# Altium footprint library IC.PcbLib: 85 footprints (part 1 of 6)
Each footprint in its own frame and in the unit in brackets; x right, y up, seen from the top. Pads: shape width x height; smd on the part's side, far side on the other; paste and mask are expansions set on the pad; w line width, h text height; cw(c..) or ccw(c..) is an arc to the next point about the centre after c.
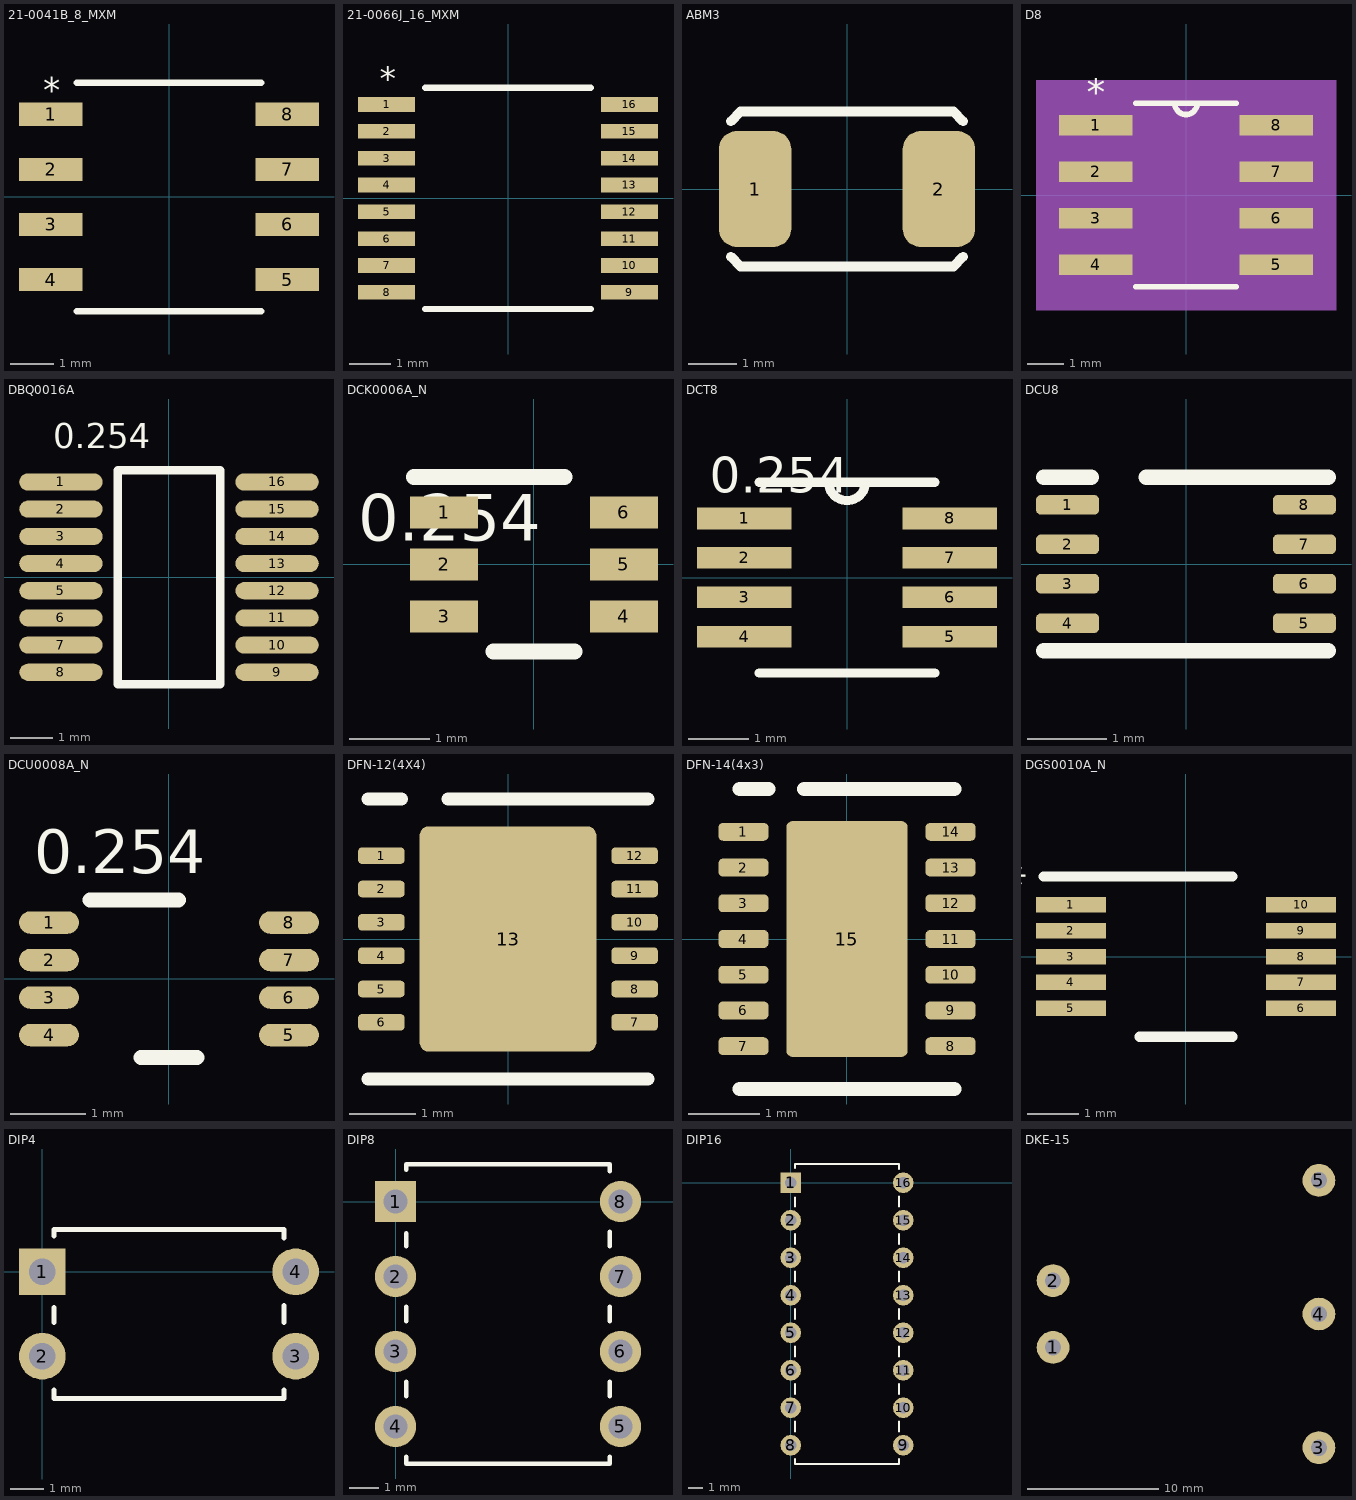
[diagram p0: the footprints below, top view; thin cyan lines are the x and y axes]

## 21-0041B_8_MXM [mil]
pads (8):
  rect 57.5x21 smd paste+0 mask+0: 1(-107.25,75) 2(-107.25,25) 3(-107.25,-25) 4(-107.25,-75) 5(107.25,-75) 6(107.25,-25) 7(107.25,25) 8(107.25,75)
Top Overlay:
  lines w6: -83.5,-103.5 83.5,-103.5 ; -83.5,103.5 83.5,103.5
  text "*" at -114.17,78.74 h39.37
3D body "21-0041B_8_MXM.step": height 69.09, standoff 0, extent -122.01,-98.5 122.01,98.5

## 21-0066J_16_MXM [mil]
pads (16):
  rect 54.5x14 smd paste+0: 1(-115.75,89.57) 2(-115.75,63.98) 3(-115.75,38.39) 4(-115.75,12.8) 5(-115.75,-12.8) 6(-115.75,-38.39) 7(-115.75,-63.98) 8(-115.75,-89.57) 9(115.75,-89.57) 10(115.75,-63.98) 11(115.75,-38.39) 12(115.75,-12.8) 13(115.75,12.8) 14(115.75,38.39) 15(115.75,63.98) 16(115.75,89.57)
Top Overlay:
  lines w6: -78.92,-105.5 78.92,-105.5 ; -78.92,105.5 78.92,105.5
  text "*" at -122.05,95.31 h39.37
3D body "21-0066J_16_MXM.step": height 43.11, standoff 0, extent -129.01,-100.51 129.02,100.52

## ABM3 [mm]
pads (2):
  rrect50% 1.5x2.4 smd: 1(-1.9,0) 2(1.9,0)
Top Overlay:
  lines w0.2: -2.4,-1.4 -2.2,-1.6 2.2,-1.6 2.4,-1.4 ; -2.4,1.4 -2.2,1.6 2.2,1.6 2.4,1.4
3D body: height 0.25, standoff 0, extent -2.5,-1.6 2.5,1.6

## D8 [mil]
pads (8):
  rect 78.74x22 smd: 1(-97,75) 2(-97,25) 3(-97,-25) 4(-97,-75) 5(97,-75) 6(97,-25) 7(97,25) 8(97,75)
Top Overlay:
  lines w6: -54.08,-98.5 54.08,-98.5 ; -54.08,98.5 54.08,98.5 ; -12,98.5 ccw(c0,98.5) 12,98.5
  text "*" at -106.3,86.61 h50
Mechanical 5:
  region: 161,-123.5 -161,-123.5 -161,123.5 161,123.5
Mechanical 13:
  lines w0: -12,98.5 ccw(c0,98.5) 12,98.5
  lines w1: -122,-85 -122,-65 -78.5,-65 -78.5,-85 -122,-85 ; -122,-35 -122,-15 -78.5,-15 -78.5,-35 -122,-35 ; -122,15 -122,35 -78.5,35 -78.5,15 -122,15 ; -122,65 -122,85 -78.5,85 -78.5,65 -122,65 ; -78.5,-98.5 78.5,-98.5 78.5,98.5 -78.5,98.5 -78.5,-98.5 ; 78.5,-85 78.5,-65 122,-65 122,-85 78.5,-85 ; 78.5,-35 78.5,-15 122,-15 122,-35 78.5,-35 ; 78.5,15 78.5,35 122,35 122,15 78.5,15 ; 78.5,65 78.5,85 122,85 122,65 78.5,65
  text "*" at -119.5,92 h50
Mechanical 15:
  region: 146,-108.5 -146,-108.5 -146,108.5 146,108.5
  lines w6: -146,-108.5 -146,108.5 146,108.5 146,-108.5 -146,-108.5
3D body "D8.step": height 69.09, standoff 0, extent -122.01,-98.5 122.01,98.5

## DBQ0016A [mm]
pads (16):
  oval 1.95x0.4 smd paste-0.102 mask+0.051: 1(-2.525,2.222) 2(-2.525,1.587) 3(-2.525,0.953) 4(-2.525,0.318) 5(-2.525,-0.318) 6(-2.525,-0.953) 7(-2.525,-1.587) 8(-2.525,-2.222) 9(2.525,-2.222) 10(2.525,-1.587) 11(2.525,-0.953) 12(2.525,-0.318) 13(2.525,0.318) 14(2.525,0.953) 15(2.525,1.587) 16(2.525,2.222)
Top Overlay:
  lines w0.2: -1.2,-2.5 1.2,-2.5 1.2,2.5 -1.2,2.5 -1.2,-2.5
  text "0.254" at -2.7,2.811 h1
3D body "DBQ0016A.stp": height 1.62, standoff 0, extent -3.011,-2.451 3.011,2.451

## DCK0006A_N [mm]
pads (6):
  rect 0.85x0.4 smd paste+0 mask+0.051: 1(-1.125,0.65) 2(-1.125,0) 3(-1.125,-0.65) 4(1.125,-0.65) 5(1.125,0) 6(1.125,0.65)
Top Overlay:
  lines w0.2: -1.499,1.092 0.381,1.092 ; -0.508,-1.092 0.508,-1.092
  text "0.254" at -2.2,0.1 h1
3D body "DCK0006A.stp": height 1, standoff 0, extent -1.05,-1 1.05,1

## DCT8 [mil]
pads (8):
  rect 61.5x14 smd: 1(-66.75,38.39) 2(-66.75,12.8) 3(-66.75,-12.8) 4(-66.75,-38.39) 5(66.75,-38.39) 6(66.75,-12.8) 7(66.75,12.8) 8(66.75,38.39)
Top Overlay:
  lines w6: -57,-62 57,-62 ; -57,62 57,62 ; -12,62 ccw(c0,62) 12,62
  text "0.254" at -89.25,47.39 h39.37
3D body "DCT0008A.stp": height 36.02, standoff 0, extent -79.15,-58.07 79.16,58.08

## DCU8 [mm]
pads (8):
  rrect50% 0.8x0.25 smd: 1(-1.5,0.75) 2(-1.5,0.25) 3(-1.5,-0.25) 4(-1.5,-0.75) 5(1.5,-0.75) 6(1.5,-0.25) 7(1.5,0.25) 8(1.5,0.75)
Top Overlay:
  lines w0.2: -1.8,-1.1 1.8,-1.1 ; -1.8,1.1 -1.2,1.1 ; -0.5,1.1 1.8,1.1
3D body "DCU0008A.stp": height 0.77, standoff 0, extent -1.55,-1 1.55,1

## DCU0008A_N [mm]
pads (8):
  oval 0.8x0.3 smd paste+0 mask+0.051: 1(-1.6,0.75) 2(-1.6,0.25) 3(-1.6,-0.25) 4(-1.6,-0.75) 5(1.6,-0.75) 6(1.6,-0.25) 7(1.6,0.25) 8(1.6,0.75)
Top Overlay:
  lines w0.2: -1.05,1.05 0.125,1.05 ; -0.375,-1.05 0.375,-1.05
  text "0.254" at -1.8,1.211 h1
3D body "DCU0008A.stp": height 0.77, standoff 0, extent -1.55,-1 1.55,1

## DFN-12(4X4) [mm]
pads (13):
  rrect50% 0.7x0.25 smd: 1(-1.9,1.25) 2(-1.9,0.75) 3(-1.9,0.25) 4(-1.9,-0.25) 5(-1.9,-0.75) 6(-1.9,-1.25) 7(1.9,-1.25) 8(1.9,-0.75) 9(1.9,-0.25) 10(1.9,0.25) 11(1.9,0.75) 12(1.9,1.25)
  rrect10% 2.65x3.38 smd: 13(0,0)
Top Overlay:
  lines w0.2: -2.1,-2.1 2.1,-2.1 ; -2.1,2.1 -1.6,2.1 ; -0.9,2.1 2.1,2.1
3D body "DFN-12_DF_LIT.step": height 0.8, standoff 0, extent -2.05,-2.05 2.05,2.05

## DFN-14(4x3) [mm]
pads (15):
  rrect50% 0.7x0.25 smd: 1(-1.45,1.5) 2(-1.45,1) 3(-1.45,0.5) 4(-1.45,0) 5(-1.45,-0.5) 6(-1.45,-1) 7(-1.45,-1.5) 8(1.45,-1.5) 9(1.45,-1) 10(1.45,-0.5) 11(1.45,0) 12(1.45,0.5) 13(1.45,1) 14(1.45,1.5)
  rrect10% 1.7x3.3 smd: 15(0,0)
Top Overlay:
  lines w0.2: -1.5,-2.1 1.5,-2.1 ; -1.5,2.1 -1.1,2.1 ; -0.6,2.1 1.5,2.1
3D body "DE_14_ADI.step": height 0.81, standoff 0, extent -1.499,-2.007 1.499,2.007

## DGS0010A_N [mm]
pads (10):
  rect 1.35x0.3 smd paste+0 mask+0.051: 1(-2.225,1) 2(-2.225,0.5) 3(-2.225,0) 4(-2.225,-0.5) 5(-2.225,-1) 6(2.225,-1) 7(2.225,-0.5) 8(2.225,0) 9(2.225,0.5) 10(2.225,1)
Top Overlay:
  lines w0.2: -2.75,1.55 0.9,1.55 ; -0.9,-1.55 0.9,-1.55
  text "*" at -2.685,1.356 h1
3D body: height 0.25, standoff 0, extent 0,0 0.254,0.254
3D body "DGS0010A.stp": height 1.11, standoff 0.01, extent -2.463,-1.5 2.463,1.5

## DIP4 [mm]
pads (4):
  rect 1.4x1.4 / inner rect 1.321x1.321 / far side rect 1.321x1.321 hole 0.8 mask+0: 1(0,0)
  round 1.4 / inner round 1.321 / far side round 1.321 hole 0.8 mask+0: 2(0,-2.54) 3(7.62,-2.54) 4(7.62,0)
Top Overlay:
  lines w0.152: 0.356,-3.562 0.356,-3.81 7.264,-3.81 7.264,-3.562 ; 0.356,-1.518 0.356,-1.082 ; 0.356,1.082 0.356,1.27 7.264,1.27 7.264,1.022 ; 7.264,-1.518 7.264,-1.022
3D body "11-5B2_TOS.step": height 4.98, standoff -2.54, extent -0.227,-3.683 7.901,1.143

## DIP8 [mm]
pads (8):
  rect 1.4x1.4 / inner rect 1.321x1.321 / far side rect 1.321x1.321 hole 0.8 mask+0: 1(0,0)
  round 1.4 / inner round 1.321 / far side round 1.321 hole 0.8 mask+0: 2(0,-2.54) 3(0,-5.08) 4(0,-7.62) 5(7.62,-7.62) 6(7.62,-5.08) 7(7.62,-2.54) 8(7.62,0)
Top Overlay:
  lines w0.152: 0.356,-8.642 0.356,-8.89 7.264,-8.89 7.264,-8.642 ; 0.356,-6.598 0.356,-6.102 ; 0.356,-4.058 0.356,-3.562 ; 0.356,-1.518 0.356,-1.082 ; 0.356,1.082 0.356,1.27 7.264,1.27 7.264,1.022 ; 7.264,-6.598 7.264,-6.102 ; 7.264,-4.058 7.264,-3.562 ; 7.264,-1.518 7.264,-1.022
3D body "11-10C4_TOS.step": height 4.98, standoff -2.54, extent -0.227,-8.763 7.901,1.143

## DIP16 [mm]
pads (16):
  rect 1.4x1.4 / inner rect 1.321x1.321 / far side rect 1.321x1.321 hole 0.8 mask+0: 1(0,0)
  round 1.4 / inner round 1.321 / far side round 1.321 hole 0.8 mask+0: 2(0,-2.54) 3(0,-5.08) 4(0,-7.62) 5(0,-10.16) 6(0,-12.7) 7(0,-15.24) 8(0,-17.78) 9(7.62,-17.78) 10(7.62,-15.24) 11(7.62,-12.7) 12(7.62,-10.16) 13(7.62,-7.62) 14(7.62,-5.08) 15(7.62,-2.54) 16(7.62,0)
Top Overlay:
  lines w0.152: 0.279,-18.733 0.279,-19.05 7.341,-19.05 7.341,-18.733 ; 0.279,-16.827 0.279,-16.193 ; 0.279,-14.287 0.279,-13.653 ; 0.279,-11.747 0.279,-11.113 ; 0.279,-9.207 0.279,-8.573 ; 0.279,-6.667 0.279,-6.033 ; 0.279,-4.127 0.279,-3.493 ; 0.279,-1.587 0.279,-0.993 ; 0.279,0.993 0.279,1.27 7.341,1.27 7.341,0.953 ; 7.341,-16.827 7.341,-16.193 ; 7.341,-14.287 7.341,-13.653 ; 7.341,-11.747 7.341,-11.113 ; 7.341,-9.207 7.341,-8.573 ; 7.341,-6.667 7.341,-6.033 ; 7.341,-4.127 7.341,-3.493 ; 7.341,-1.587 7.341,-0.953
3D body "DIP16_CNY74_VIS.step": height 4.83, standoff -2.54, extent -0.127,-18.923 8.001,1.143

## DKE-15 [mm]
pads (5):
  round 2.5 hole 1.25: 1(15.25,22.85) 2(15.25,27.95) 3(35.55,15.2) 4(35.55,25.4) 5(35.55,35.6)
3D body "DKE-15.STEP": height 11, standoff -5.8, extent 0,0 50.8,50.8